# Altium footprint library USB Connectors WR-COM.PcbLib: 51 footprints (part 2 of 4)
Each footprint in its own frame and in the unit in brackets; x right, y up, seen from the top. Pads: shape width x height; smd on the part's side, far side on the other; paste and mask are expansions set on the pad; w line width, h text height; cw(c..) or ccw(c..) is an arc to the next point about the centre after c.
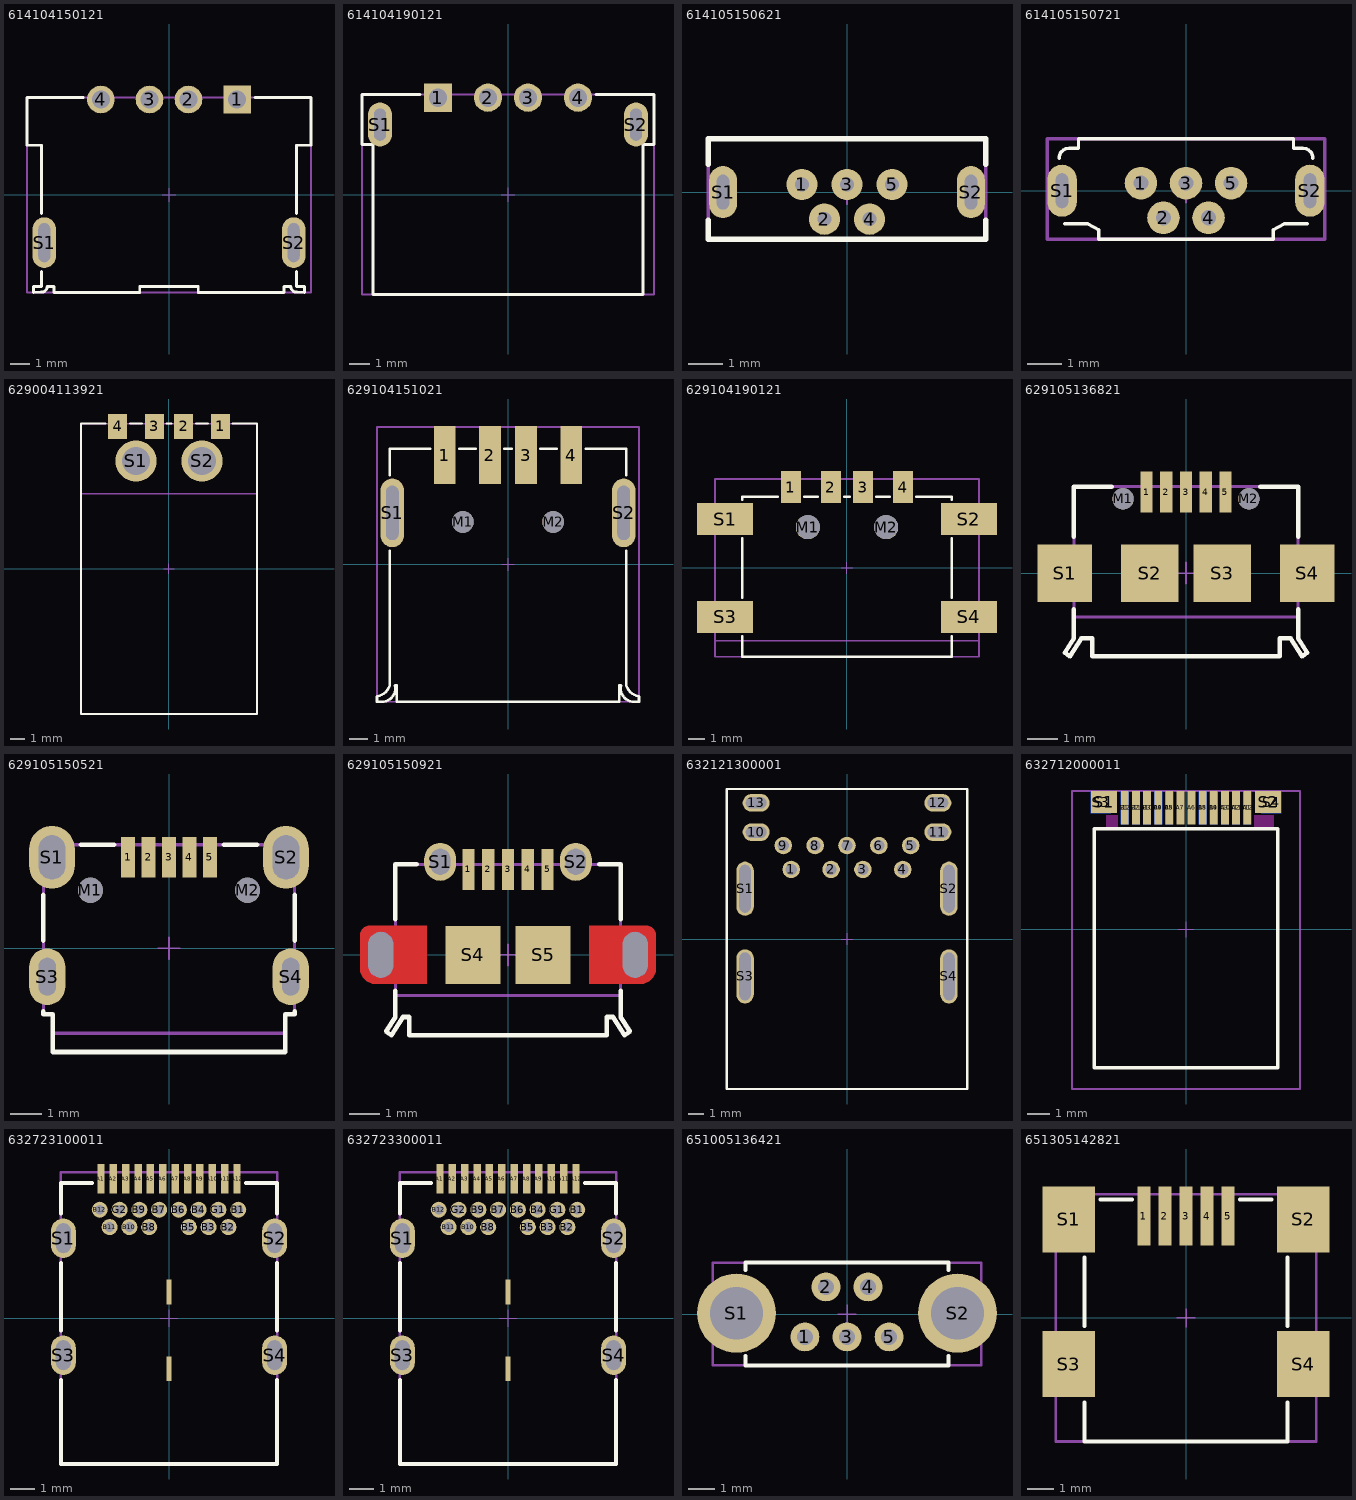
[diagram p1: the footprints below, top view; thin cyan lines are the x and y axes]

## 614104150121 [mm] "USB 2.0 THT Type A Horizontal Slim Type"
height 6.82
pads (6):
  rect 1.42x1.42 hole 0.92: 1(3.5,4.9)
  round 1.42 hole 0.92: 2(1,4.9) 3(-1,4.9) 4(-3.5,4.9)
  oval 1.2x2.6 hole 0.6 slot 2 at 90 deg: S1(-6.4,-2.45) S2(6.4,-2.45)
Top Overlay:
  lines w0.15: -6.55,-3.93 -6.55,-4.69 -6.95,-4.69 -6.95,-5 -6.56,-4.99 ccw(c-6.55,-4.69) -6.25,-4.69 -5.9,-4.69 -5.9,-5 -1.5,-5 -1.5,-4.7 1.5,-4.7 1.5,-5 5.9,-5 5.9,-4.69 6.25,-4.69 ccw(c6.55,-4.69) 6.56,-4.99 6.95,-5 6.95,-4.69 6.55,-4.69 6.55,-3.93 ; -6.55,-0.96 -6.55,2.55 -7.3,2.55 -7.3,5 -4.4,5 ; 4.41,5 7.3,5 7.3,2.55 6.55,2.55 6.55,-0.96
Mechanical 13:
  lines w0.1: -7.3,-5 -7.3,5 7.3,5 7.3,-5 -7.3,-5
Mechanical 15:
  lines w0.05: -0.35,0 0.35,0 ; 0,-0.35 0,0.35
3D body "614104150121.stp": height 7.26, standoff -1.56, extent -7.3,-5 7.3,5

## 614104190121 [mm] "USB 2.0 Type A Horizontal THT Short Type"
height 5.72
pads (6):
  rect 1.42x1.42 hole 0.92: 1(-3.5,4.85)
  round 1.42 hole 0.92: 2(-1,4.85) 3(1,4.85) 4(3.5,4.85)
  oval 1.2x2.2 hole 0.6 slot 1.6 at 90 deg: S1(-6.4,3.5) S2(6.4,3.5)
Top Overlay:
  lines w0.15: -4.41,5 -7.3,5 -7.3,2.5 -6.75,2.5 -6.75,-5 6.75,-5 6.75,2.5 7.3,2.5 7.3,5 4.4,5
Mechanical 13:
  lines w0.1: -7.3,-5 7.3,-5 7.3,5 -7.3,5 -7.3,-5
Mechanical 15:
  lines w0.05: -0.35,0 0.35,0 ; 0,-0.35 0,0.35
3D body "614104190121.stp": height 5.94, standoff -1.77, extent -7.3,-5 7.3,5

## 614105150621 [mm] "Micro USB 2.0 Type AB Vertical 5 Contacts"
height 5.61
pads (7):
  round 0.9 hole 0.4: 1(-1.3,0.22) 2(-0.65,-0.78) 3(0,0.22) 4(0.65,-0.78) 5(1.3,0.22)
  oval 0.8x1.5 hole 0.35 slot 1 at 90 deg: S1(-3.575,0) S2(3.575,0)
Top Overlay:
  lines w0.15: -4,-0.8 -4,-1.36 4,-1.36 4,-0.8 ; -4,0.8 -4,1.54 4,1.54 4,0.8
Mechanical 1:
  text "PCB Thickness 1.0mm" at -3.5,-2 h0.76
Mechanical 13:
  lines w0.1: -4,-1.36 4,-1.36 4,1.54 -4,1.54 -4,-1.36
Mechanical 15:
  lines w0.05: -0.35,0 0.35,0 ; 0,-0.35 0,0.35
3D body "614105150621.stp": height 5.66, standoff -1.45, extent -4,-1.36 4,1.54

## 614105150721 [mm] "Micro USB 2.0 Type B Vertical 5 Contacts"
height 5.61
pads (7):
  round 0.94 hole 0.44: 1(-1.3,0.22) 2(-0.65,-0.78) 3(0,0.22) 4(0.65,-0.78) 5(1.3,0.22)
  oval 0.85x1.5 hole 0.35 slot 1 at 90 deg: S1(-3.575,0) S2(3.575,0)
Top Overlay:
  lines w0.1: -3.66,0.94 cw(c-3.38,0.94) -3.373,1.22 -3.1,1.22 -3.1,1.5 3.1,1.5 3.1,1.22 3.373,1.22 cw(c3.38,0.94) 3.66,0.94 ; -3.5,-0.953 -2.828,-0.953 -2.51,-1.13 -2.51,-1.4 2.51,-1.4 2.51,-1.13 2.828,-0.953 3.5,-0.953
Mechanical 1:
  text "PCB Thickness 1.0mm" at -3.5,-2.1 h0.76
Mechanical 13:
  lines w0.1: -4,-1.4 -4,1.5 4,1.5 4,-1.4 -4,-1.4
Mechanical 15:
  lines w0.05: -0.35,0 0.35,0 ; 0,-0.35 0,0.35
3D body "614105150721.stp": height 5.61, standoff -1.84, extent -4,-1.4 4,1.5

## 629004113921 [mm] "USB 2.0 Plug Type A SMT with Clip"
height 19.8
pads (6):
  rect 1.3x1.7 smd: 1(3.5,9.7) 2(1,9.7) 3(-1,9.7) 4(-3.5,9.7)
  round 2.8 hole 1.9: S1(-2.25,7.35) S2(2.25,7.35)
Top Overlay:
  lines w0.15: -4.35,9.9 -6,9.9 -6,-9.9 6,-9.9 6,9.9 4.35,9.9 ; -2.65,9.9 -1.85,9.9 ; -0.15,9.9 0.15,9.9 ; 1.85,9.9 2.65,9.9
Mechanical 1:
  lines w0.1: -6,5.1 6,5.1
  text "PCB Edge" at -2,4.05 h1
Mechanical 13:
  lines w0.1: -6,-9.9 6,-9.9 6,9.9 -6,9.9 -6,-9.9
Mechanical 15:
  lines w0.05: -0.35,0 0.35,0 ; 0,-0.35 0,0.35
3D body "629004113921.stp": height 2.25, standoff -2.25, extent -6,-9.9 6,9.9

## 629104151021 [mm] "USB 2.0 Type A Horizontal SMT with pegs"
height 7
pads (8):
  rect 1.2x3.2 smd: 1(-3.5,6.05) 2(-1,6.05) 3(1,6.05) 4(3.5,6.05)
  round 1.2 hole 1.2 unplated: M1(-2.5,2.35) M2(2.5,2.35)
  oval 1.3x3.8 hole 0.7 slot 3 at 90 deg: S1(-6.4,2.85) S2(6.4,2.85)
Top Overlay:
  lines w0.15: -7.25,-7.308 -7.25,-7.6 -6.87,-7.599 ccw(c-6.983,-6.857) -6.25,-6.7 -6.15,-6.7 -6.15,-7.6 6.15,-7.6 6.15,-6.7 6.25,-6.7 ccw(c6.983,-6.857) 6.87,-7.599 7.25,-7.6 7.25,-7.308 ; -7.249,-7.308 ccw(c-7.39,-6.44) -6.55,-6.7 -6.55,0.76 ; -6.55,4.94 -6.55,6.4 -4.3,6.4 ; -2.7,6.4 -1.8,6.4 ; -0.2,6.4 0.2,6.4 ; 1.8,6.4 2.7,6.4 ; 4.3,6.4 6.55,6.4 6.55,4.94 ; 6.55,0.76 6.55,-6.7 ccw(c7.39,-6.44) 7.249,-7.308
Mechanical 1:
  text "PCB Thickness 1.6mm" at -3.15,-8.4 h0.76
Mechanical 13:
  lines w0.1: -7.25,-7.6 -7.25,7.6 7.25,7.6 7.25,-7.6 -7.25,-7.6
Mechanical 15:
  lines w0.05: -0.35,0 0.35,0 ; 0,-0.35 0,0.35
3D body "629104151021.stp": height 7.4, standoff -2.1, extent -7.25,-7.6 7.25,7.6

## 629104190121 [mm] "USB 2.0 Type A Horizontal SMT Short Type"
height 6.3
pads (10):
  rect 1.25x2 smd: 1(-3.5,5.045) 2(-1,5.045) 3(1,5.045) 4(3.5,5.045)
  round 1.5 hole 1.5 unplated: M1(-2.45,2.545) M2(2.45,2.545)
  rect 3.5x2 smd: S1(-7.625,3.045) S2(7.625,3.045) S3(-7.625,-3.055) S4(7.625,-3.055)
Top Overlay:
  lines w0.15: -6.55,-4.255 -6.55,-5.555 6.55,-5.555 6.55,-4.255 ; -6.55,-1.855 -6.55,1.845 ; -6.55,4.245 -6.55,4.445 -4.32,4.445 ; -2.68,4.445 -1.82,4.445 ; -0.18,4.445 0.18,4.445 ; 1.82,4.445 2.68,4.445 ; 4.32,4.445 6.55,4.445 6.55,4.245 ; 6.55,-1.855 6.55,1.845
Mechanical 1:
  lines w0.1: -8.25,-4.555 8.25,-4.555
  text "PCB Edge" at -2,-4.155 h1
Mechanical 13:
  lines w0.1: -8.25,-5.555 8.25,-5.555 8.25,5.555 -8.25,5.555 -8.25,-5.555
Mechanical 15:
  lines w0.05: -0.35,0 0.35,0 ; 0,-0.35 0,0.35
3D body "629104190121.stp": height 6.37, standoff -0.1, extent -8.25,-5.555 8.25,5.554

## 629105136821 [mm] "Micro USB 2.0 SMT Type B Horizontal 5 Contacts"
height 3
pads (11):
  rect 0.4x1.35 smd: 1(-1.3,2.675) 2(-0.65,2.675) 3(0,2.675) 4(0.65,2.675) 5(1.3,2.675)
  round 0.7 hole 0.7 unplated: M1(-2.075,2.45) M2(2.075,2.45)
  rect 1.8x1.9 smd: S1(-4,0) S4(4,0)
  rect 1.9x1.9 smd: S2(-1.2,0) S3(1.2,0)
Top Overlay:
  lines w0.15: -3.7,-1.2 -3.7,-2.15 -4,-2.625 -3.825,-2.75 -3.45,-2.15 -3.1,-2.15 -3.1,-2.75 3.1,-2.75 3.1,-2.15 3.45,-2.15 3.825,-2.75 4,-2.625 3.7,-2.15 3.7,-1.2 ; -3.7,1.2 -3.7,2.85 -2.45,2.85 ; 2.45,2.85 3.7,2.85 3.7,1.2
Mechanical 1:
  lines w0.1: -3.7,-1.45 3.7,-1.45
  text "PCB Edge" at -1.4,-2.1 h0.76
Mechanical 13:
  lines w0.1: -4,-2.625 -3.7,-2.15 -3.7,2.85 3.7,2.85 3.7,-2.15 4,-2.625 3.825,-2.75 3.45,-2.15 3.1,-2.15 3.1,-2.75 -3.1,-2.75 -3.1,-2.15 -3.45,-2.15 -3.825,-2.75 -4,-2.625
Mechanical 15:
  lines w0.05: -0.35,0 0.35,0 ; 0,-0.35 0,0.35
3D body "629105136821.stp": height 2.77, standoff -0.53, extent -4,-2.73 4,3.173

## 629105150521 [mm] "Micro USB 2.0 SMT Type B Horizontal 5 Contacts High Current"
height 2.66
pads (11):
  rect 0.45x1.3 smd: 1(-1.3,2.9) 2(-0.65,2.9) 3(0,2.9) 4(0.65,2.9) 5(1.3,2.9)
  round 0.8 hole 0.8 unplated: M1(-2.5,1.85) M2(2.5,1.85)
  oval 1.45x2 hole 0.85 slot 1.4 at 90 deg: S1(-3.725,2.9) S2(3.725,2.9)
  oval 1.15x1.8 hole 0.55 slot 1.2 at 90 deg: S3(-3.875,-0.9) S4(3.875,-0.9)
Top Overlay:
  lines w0.15: -4,-2 -4,-2.1 -3.7,-2.1 -3.7,-3.3 3.7,-3.3 3.7,-2.1 4,-2.1 4,-2 ; -4,0.25 -4,1.7 ; -2.8,3.3 -1.75,3.3 ; 1.75,3.3 2.8,3.3 ; 4,0.25 4,1.7
Mechanical 1:
  lines w0.1: -3.7,-2.7 3.7,-2.7
  text "PCB Edge" at -1.4,-2.5 h0.76
  text "PCB Thickness 1.2mm" at -3.4,-4 h0.76
Mechanical 13:
  lines w0.1: -4,-2.1 -4,3.3 4,3.3 4,-2.1 3.7,-2.1 3.7,-3.3 -3.7,-3.3 -3.7,-2.1 -4,-2.1
Mechanical 15:
  lines w0.05: -0.35,0 0.35,0 ; 0,-0.35 0,0.35
3D body "629105150521.stp": height 2.77, standoff -1.75, extent -4,-3.3 4,3.303

## 629105150921 [mm] "Micro USB 2.0 Type AB Horizontal"
height 3
pads (11):
  rect 0.4x1.35 smd: 1(-1.3,2.805) 2(-0.65,2.805) 3(0,2.805) 4(0.65,2.805) 5(1.3,2.805)
  oval 1.05x1.25 hole 0.65 slot 0.85 at 90 deg: S1(-2.225,3.055) S2(2.225,3.055)
  round 0 / inner round 0 / far side oval 1.4x2.1 hole 0.825 slot 1.5 at 90 deg: S3(-4.175,0) S6(4.175,0)
  rect 1.8x1.9 smd: S4(-1.15,0) S5(1.15,0)
Top Layer:
  region: -4.353,-0.95 -4.452,-0.95 -4.636,-0.874 -4.776,-0.733 -4.852,-0.549 -4.852,-0.45 -4.852,0.65 -4.852,0.71 -4.807,0.82 -4.722,0.904 -4.612,0.95 -4.553,0.95 -2.668,0.95 -2.668,-0.95
  region: 4.353,-0.95 4.452,-0.95 4.636,-0.874 4.776,-0.733 4.852,-0.549 4.852,-0.45 4.852,0.65 4.852,0.71 4.807,0.82 4.722,0.904 4.612,0.95 4.553,0.95 2.668,0.95 2.668,-0.95
Top Overlay:
  lines w0.15: -3.7,-1.18 -3.7,-2.04 -4,-2.515 -3.825,-2.64 -3.45,-2.04 -3.24,-2.04 -3.24,-2.64 3.24,-2.64 3.24,-2.04 3.45,-2.04 3.825,-2.64 4,-2.515 3.7,-2.04 3.7,-1.18 ; -3.7,1.17 -3.7,2.97 -3,2.97 ; 3,2.97 3.7,2.97 3.7,1.17
Mechanical 1:
  lines w0.1: -3.7,-1.33 3.7,-1.33
  text "PCB Edge" at -1.5,-2.1 h0.76
  text "PCB Thickness 1.2mm" at -3.5,-3.4 h0.76
Mechanical 13:
  lines w0.1: -4,-2.515 -3.825,-2.64 -3.45,-2.04 -3.24,-2.04 -3.24,-2.64 3.24,-2.64 3.24,-2.04 3.45,-2.04 3.825,-2.64 4,-2.515 3.7,-2.04 3.7,2.97 -3.7,2.97 -3.7,-2.04 -4,-2.515
Mechanical 15:
  lines w0.05: -0.35,0 0.35,0 ; 0,-0.35 0,0.35
3D body "629105150921.stp": height 2.78, standoff -0.5, extent -4.3,-2.64 4.3,3.23

## 632121300001 [mm] "USB 3.1 Type A Receptacle Horizontal THT Power Delivery"
height 8.01
pads (17):
  round 1.1 hole 0.7: 1(-3.5,4.365) 2(-1,4.365) 3(1,4.365) 4(3.5,4.365) 5(4,5.865) 6(2,5.865) 7(0,5.865) 8(-2,5.865) 9(-4,5.865)
  oval 1.7x1.1 hole 0.7 slot 1.3 at 0 deg: 10(-5.7,6.705) 11(5.7,6.705) 12(5.7,8.545) 13(-5.7,8.545)
  oval 1.1x3.4 hole 0.7 slot 3 at 90 deg: S1(-6.4,3.155) S2(6.4,3.155) S3(-6.4,-2.345) S4(6.4,-2.345)
Top Overlay:
  lines w0.15: -7.55,-9.415 -7.55,9.415 7.55,9.415 7.55,-9.415 -7.55,-9.415
Mechanical 1:
  text "PCB Thickness 1.6mm" at -3.15,-10.15 h0.76
Mechanical 13:
  lines w0.1: -7.55,-9.415 7.55,-9.415 7.55,9.415 -7.55,9.415 -7.55,-9.415
Mechanical 15:
  lines w0.05: -0.35,0 0.35,0 ; 0,-0.35 0,0.35
3D body "632121300001.stp": height 8.01, standoff -1.81, extent -7.55,-9.415 7.55,9.415

## 632712000011 [mm] "USB 3.1 Type C Plug Horizontal SMT"
height 2.4
pads (26):
  rect 0.35x1.5 smd: A1(2.75,5.475) A2(2.25,5.475) A3(1.75,5.475) A4(1.25,5.475) A5(0.75,5.475) A6(0.25,5.475) A7(-0.25,5.475) A8(-0.75,5.475) A9(-1.25,5.475) A10(-1.75,5.475) A11(-2.25,5.475) A12(-2.75,5.475)
  rect 0.35x1.5 smd far side: B1(-2.75,5.475) B2(-2.25,5.475) B3(-1.75,5.475) B4(-1.25,5.475) B5(-0.75,5.475) B8(0.75,5.475) B9(1.25,5.475) B10(1.75,5.475) B11(2.25,5.475) B12(2.75,5.475)
  rect 1.18x1 smd: S1(-3.69,5.725) S2(3.69,5.725)
  rect 0.9x1 smd far side: S3(-3.825,5.725) S4(3.825,5.725)
Top Overlay:
  lines w0.15: -4.125,-6.225 -4.125,4.525 4.125,4.525 4.125,-6.225 -4.125,-6.225
Bottom Overlay:
  lines w0.15: -4.125,-6.225 4.125,-6.225 4.125,4.525 -4.125,4.525 -4.125,-6.225
Keep-Out Layer:
  board cut-out: -3.58,4.525 -3.58,5.125 -3.08,5.125 -3.08,4.525
  board cut-out: 3.075,4.525 3.075,5.125 3.945,5.125 3.945,4.525
Mechanical 1:
  text "PCB Thickness 0.8mm" at -3.5,-7.7 h0.76
Mechanical 13:
  lines w0.1: -5.125,-7.175 5.125,-7.175 5.125,6.225 -5.125,6.225 -5.125,-7.175
Mechanical 15:
  lines w0.05: -0.35,0 0.35,0 ; 0,-0.35 0,0.35
3D body "632712000011.stp": height 1.75, standoff -2.45, extent -5.125,-7.175 5.125,6.225

## 632723100011 [mm] "USB 3.1 Type C Receptacle Horizontal THR"
height 2.96
pads (32):
  rect 0.3x1.2 smd: A1(-2.75,5.635) A2(-2.25,5.635) A3(-1.75,5.635) A4(-1.25,5.635) A5(-0.75,5.635) A6(-0.25,5.635) A7(0.25,5.635) A8(0.75,5.635) A9(1.25,5.635) A10(1.75,5.635) A11(2.25,5.635) A12(2.75,5.635)
  round 0.65 hole 0.4: B1(2.8,4.385) B2(2.4,3.685) B3(1.6,3.685) B4(1.2,4.385) B5(0.8,3.685) B6(0.4,4.385) B7(-0.4,4.385) B8(-0.8,3.685) B9(-1.2,4.385) B10(-1.6,3.685) B11(-2.4,3.685) B12(-2.8,4.385) G1(2,4.385) G2(-2,4.385)
  oval 1x1.6 hole 0.6 slot 1.2 at 90 deg: S1(-4.27,3.235) S2(4.27,3.235) S3(-4.27,-1.495) S4(4.27,-1.495)
  rect 0.2x1 smd: ""(0,-2.045) ""(0,1.055)
Top Overlay:
  lines w0.15: -4.37,-2.485 -4.37,-5.895 4.37,-5.895 4.37,-2.485 ; -4.37,-0.495 -4.37,2.245 ; -4.37,4.225 -4.37,5.465 -3.1,5.465 ; 3.1,5.465 4.37,5.465 4.37,4.225 ; 4.37,-0.495 4.37,2.245
Mechanical 1:
  text "PCB Thickness 1.0mm" at -3.15,-6.65 h0.76
Mechanical 13:
  lines w0.1: -4.37,-5.895 -4.37,5.895 4.37,5.895 4.37,-5.895 -4.37,-5.895
Mechanical 15:
  lines w0.05: -0.35,0 0.35,0 ; 0,-0.35 0,0.35
3D body "632723100011.stp": height 3.05, standoff -1.81, extent -4.37,-5.895 4.37,5.899

## 632723300011 [mm] "USB 3.1 Type C Receptacle Horizontal THR"
height 2.96
pads (32):
  rect 0.3x1.2 smd: A1(-2.75,5.635) A2(-2.25,5.635) A3(-1.75,5.635) A4(-1.25,5.635) A5(-0.75,5.635) A6(-0.25,5.635) A7(0.25,5.635) A8(0.75,5.635) A9(1.25,5.635) A10(1.75,5.635) A11(2.25,5.635) A12(2.75,5.635)
  round 0.65 hole 0.4: B1(2.8,4.385) B2(2.4,3.685) B3(1.6,3.685) B4(1.2,4.385) B5(0.8,3.685) B6(0.4,4.385) B7(-0.4,4.385) B8(-0.8,3.685) B9(-1.2,4.385) B10(-1.6,3.685) B11(-2.4,3.685) B12(-2.8,4.385) G1(2,4.385) G2(-2,4.385)
  oval 1x1.6 hole 0.6 slot 1.2 at 90 deg: S1(-4.27,3.235) S2(4.27,3.235) S3(-4.27,-1.495) S4(4.27,-1.495)
  rect 0.2x1 smd: ""(0,-2.045) ""(0,1.055)
Top Overlay:
  lines w0.15: -4.37,-2.485 -4.37,-5.895 4.37,-5.895 4.37,-2.485 ; -4.37,-0.495 -4.37,2.245 ; -4.37,4.225 -4.37,5.465 -3.1,5.465 ; 3.1,5.465 4.37,5.465 4.37,4.225 ; 4.37,-0.495 4.37,2.245
Mechanical 1:
  text "PCB Thickness 1.6mm" at -3.5,-6.65 h0.76
Mechanical 13:
  lines w0.1: -4.37,-5.895 4.37,-5.895 4.37,5.895 -4.37,5.895 -4.37,-5.895
Mechanical 15:
  lines w0.05: -0.35,0 0.35,0 ; 0,-0.35 0,0.35
3D body "632723300011.stp": height 3.05, standoff -1.81, extent -4.37,-5.895 4.37,5.899

## 651005136421 [mm] "Mini USB 2.0 Type B Vertical 5 Contacts"
height 9.2
pads (7):
  round 1.1 hole 0.6: 1(-1.6,-0.87) 2(-0.8,1.03) 3(0,-0.87) 4(0.8,1.03) 5(1.6,-0.87)
  round 3 hole 2: S1(-4.2,0.03) S2(4.2,0.03)
Top Overlay:
  lines w0.15: -3.85,-1.6 -3.85,-1.95 3.85,-1.95 3.85,-1.6 ; -3.85,1.67 -3.85,1.95 3.85,1.95 3.85,1.67
Mechanical 13:
  lines w0.1: -5.1,-1.95 -5.1,1.95 5.1,1.95 5.1,-1.95 -5.1,-1.95
Mechanical 15:
  lines w0.05: -0.35,0 0.35,0 ; 0,-0.35 0,0.35
3D body "651005136421.stp": height 9.45, standoff -2.55, extent -5.099,-1.92 5.098,1.98

## 651305142821 [mm] "Mini USB 2.0 Type AB SMT Horizontal 5 Contacts"
height 4
pads (9):
  rect 0.5x2.25 smd: 1(-1.6,3.865) 2(-0.8,3.865) 3(0,3.865) 4(0.8,3.865) 5(1.6,3.865)
  rect 2x2.5 smd: S1(-4.45,3.74) S2(4.45,3.74) S3(-4.45,-1.76) S4(4.45,-1.76)
Top Overlay:
  lines w0.15: -3.85,-3.21 -3.85,-4.7 3.85,-4.7 3.85,-3.21 ; -3.85,-0.31 -3.85,2.29 ; -3.25,4.5 -2.05,4.5 ; 2.05,4.5 3.25,4.5 ; 3.85,-0.31 3.85,2.29
Mechanical 13:
  lines w0.1: -4.95,-4.7 -4.95,4.7 4.95,4.7 4.95,-4.7 -4.95,-4.7
Mechanical 15:
  lines w0.05: -0.35,0 0.35,0 ; 0,-0.35 0,0.35
3D body "651305142821.stp": height 4.1, standoff 0, extent -4.95,-4.7 4.95,4.7